# Altium footprint library Capacitor.PcbLib: 59 footprints (part 4 of 4)
Each footprint in its own frame and in the unit in brackets; x right, y up, seen from the top. Pads: shape width x height; smd on the part's side, far side on the other; paste and mask are expansions set on the pad; w line width, h text height; cw(c..) or ccw(c..) is an arc to the next point about the centre after c.
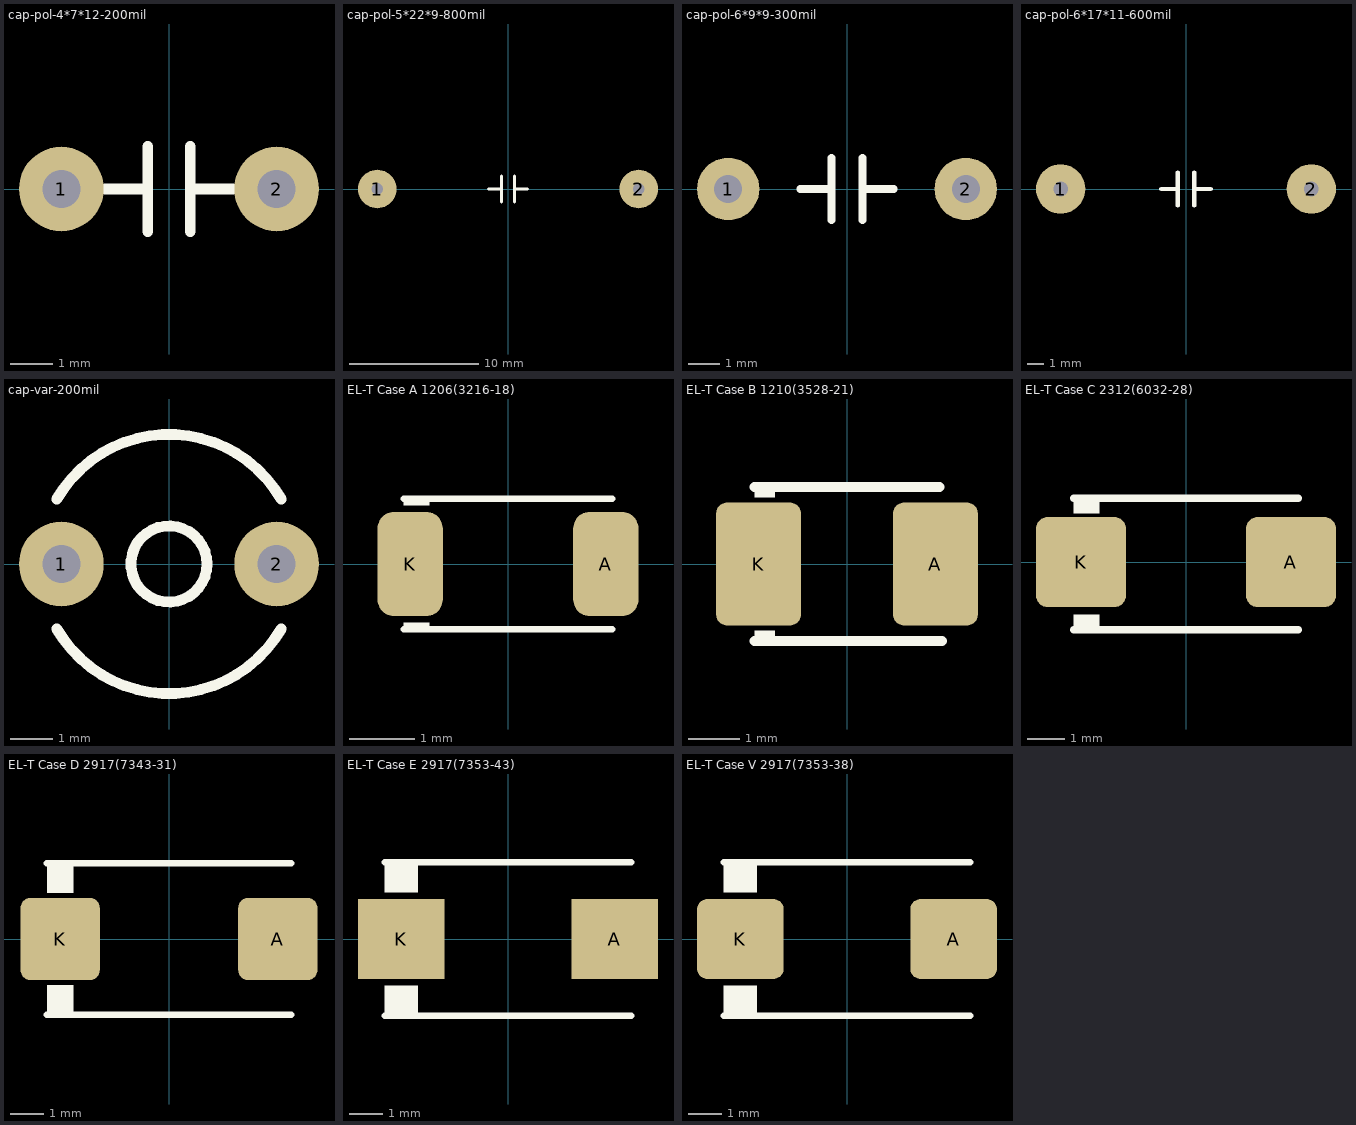
[diagram p3: the footprints below, top view; thin cyan lines are the x and y axes]

## cap-pol-4*7*12-200mil [mm] "Polyester Capacitor - Dimenssion 4*7*12 (W,L,H) - 200mil Pitch"
height 12
pads (2):
  round 2 hole 0.9: 1(-2.54,0) 2(2.54,0)
Top Overlay:
  lines w0.254: -1.5,0 -0.5,0 ; -0.5,-1 -0.5,1 ; 0.5,-1 0.5,1 ; 0.5,0 1.5,0

## cap-pol-5*22*9-800mil [mm] "Polyester Capacitor - Dimenssion 5*22*9 (W,L,H) - 800 mil Pitch"
height 9
pads (2):
  round 3 hole 0.9: 1(-10.16,0) 2(10.16,0)
Top Overlay:
  lines w0.254: -1.5,0 -0.5,0 ; -0.5,-1 -0.5,1 ; 0.5,-1 0.5,1 ; 0.5,0 1.5,0

## cap-pol-6*9*9-300mil [mm] "Polyester Capacitor - Dimenssion 6*9*9 (W,L,H) - 300mil Pitch"
height 9
pads (2):
  round 2 hole 0.9: 1(-3.81,0) 2(3.81,0)
Top Overlay:
  lines w0.254: -1.5,0 -0.5,0 ; -0.5,-1 -0.5,1 ; 0.5,-1 0.5,1 ; 0.5,0 1.5,0

## cap-pol-6*17*11-600mil [mm] "Polyester Capacitor - Dimenssion 6*17*11 (W,L,H) - 600mil Pitch"
height 11
pads (2):
  round 3 hole 0.9: 1(-7.62,0) 2(7.62,0)
Top Overlay:
  lines w0.254: -1.5,0 -0.5,0 ; -0.5,-1 -0.5,1 ; 0.5,-1 0.5,1 ; 0.5,0 1.5,0

## cap-var-200mil [mm]
pads (2):
  round 2 hole 0.9: 1(-2.54,0) 2(2.54,0)
Top Overlay:
  circle w0.254: c0,0 r0.898
  lines w0.254: -2.649,-1.529 ccw(c0,0) 2.649,-1.529 ; -2.649,1.529 cw(c0,0) 2.649,1.529

## EL-T Case A 1206(3216-18) [mm] "Capacitor, SM Tantalum; Body 3.2 x 1.8 mm (LxW typ)"
height 1.8
pads (2):
  rrect50% 1x1.6 smd: A(1.5,0) K(-1.5,0)
Top Overlay:
  rectangle: -1.6,0.9 -1.2,1
  rectangle: -1.6,-1 -1.2,-0.9
  lines w0.1: -1.6,-1 1.6,-1 ; -1.6,1 1.6,1
3D body "EL-T SMD Case A 1206(3216-1.8).STEP": height 1.61, standoff 0, extent -1.595,-0.8 1.595,0.8

## EL-T Case B 1210(3528-21) [mm] "Capacitor, SM Tantalum; Body 3.5 x 2.1 mm (LxW typ)"
height 2.1
pads (2):
  rrect25% 1.65x2.4 smd: A(1.725,0) K(-1.725,0)
Top Overlay:
  rectangle: -1.8,-1.4 -1.4,-1.3
  rectangle: -1.8,1.3 -1.4,1.4
  lines w0.2: -1.8,-1.5 1.85,-1.5 ; -1.8,1.5 1.8,1.5
3D body "EL-T SMD Case B 1210(3228-2.1).STEP": height 1.91, standoff 0, extent -1.746,-1.4 1.746,1.4

## EL-T Case C 2312(6032-28) [mm] "Capacitor, SM Tantalum; Body 6.0 x 2.8 mm (LxW typ)"
height 2.8
pads (2):
  rrect25% 2.4x2.4 smd: A(2.8,0) K(-2.8,0)
Top Overlay:
  rectangle: -3,-1.7 -2.3,-1.4
  rectangle: -3,1.3 -2.3,1.6
  lines w0.2: -3,-1.8 3,-1.8 ; -3,1.7 3,1.7
3D body "EL-T SMD Case C 2312(6032-2.8).STEP": height 2.51, standoff 0, extent -2.997,-1.6 2.997,1.6

## EL-T Case D 2917(7343-31) [mm] "Capacitor, SM Tantalum; Body 7.3 x 3.1 mm (LxW typ)"
height 3.1
pads (2):
  rrect25% 2.4x2.5 smd: A(3.3,0) K(-3.3,0)
Top Overlay:
  rectangle: -3.7,-2.2 -2.9,-1.4
  rectangle: -3.7,1.4 -2.9,2.2
  lines w0.2: -3.7,-2.3 3.7,-2.3 ; -3.7,2.3 3.7,2.3
3D body "EL-T SMD Case D 2917(7343-3.1).STEP": height 2.81, standoff 0, extent -3.647,-2.15 3.647,2.15

## EL-T Case E 2917(7353-43) [mm] "Capacitor, SM Tantalum; Body 7.3 x 4.3 mm (LxW typ)"
height 4.3
pads (2):
  rect 2.6x2.4 smd: A(3.2,0) K(-3.2,0)
Top Overlay:
  rectangle: -3.7,-2.2 -2.7,-1.4
  rectangle: -3.7,1.4 -2.7,2.2
  lines w0.2: -3.7,-2.3 3.7,-2.3 ; -3.7,2.3 3.7,2.3
3D body "EL-T SMD Case E 2917(7343-4.3).STEP": height 4.11, standoff 0, extent -3.647,-2.15 3.647,2.15

## EL-T Case V 2917(7353-38) [mm] "Capacitor, SM Tantalum; Body 7.3 x 3.8 mm (LxW typ)"
height 3.8
pads (2):
  rrect25% 2.6x2.4 smd: A(3.2,0) K(-3.2,0)
Top Overlay:
  rectangle: -3.7,-2.2 -2.7,-1.4
  rectangle: -3.7,1.4 -2.7,2.2
  lines w0.2: -3.7,-2.3 3.7,-2.3 ; -3.7,2.3 3.7,2.3
3D body "EL-T SMD Case V 2917(7343-2.0).STEP": height 2.01, standoff 0, extent -3.646,-2.15 3.646,2.15